# Altium footprint library chipfc_libs.PCBLIB: 283 footprints (part 15 of 18)
Each footprint in its own frame and in the unit in brackets; x right, y up, seen from the top. Pads: shape width x height; smd on the part's side, far side on the other; paste and mask are expansions set on the pad; w line width, h text height; cw(c..) or ccw(c..) is an arc to the next point about the centre after c.
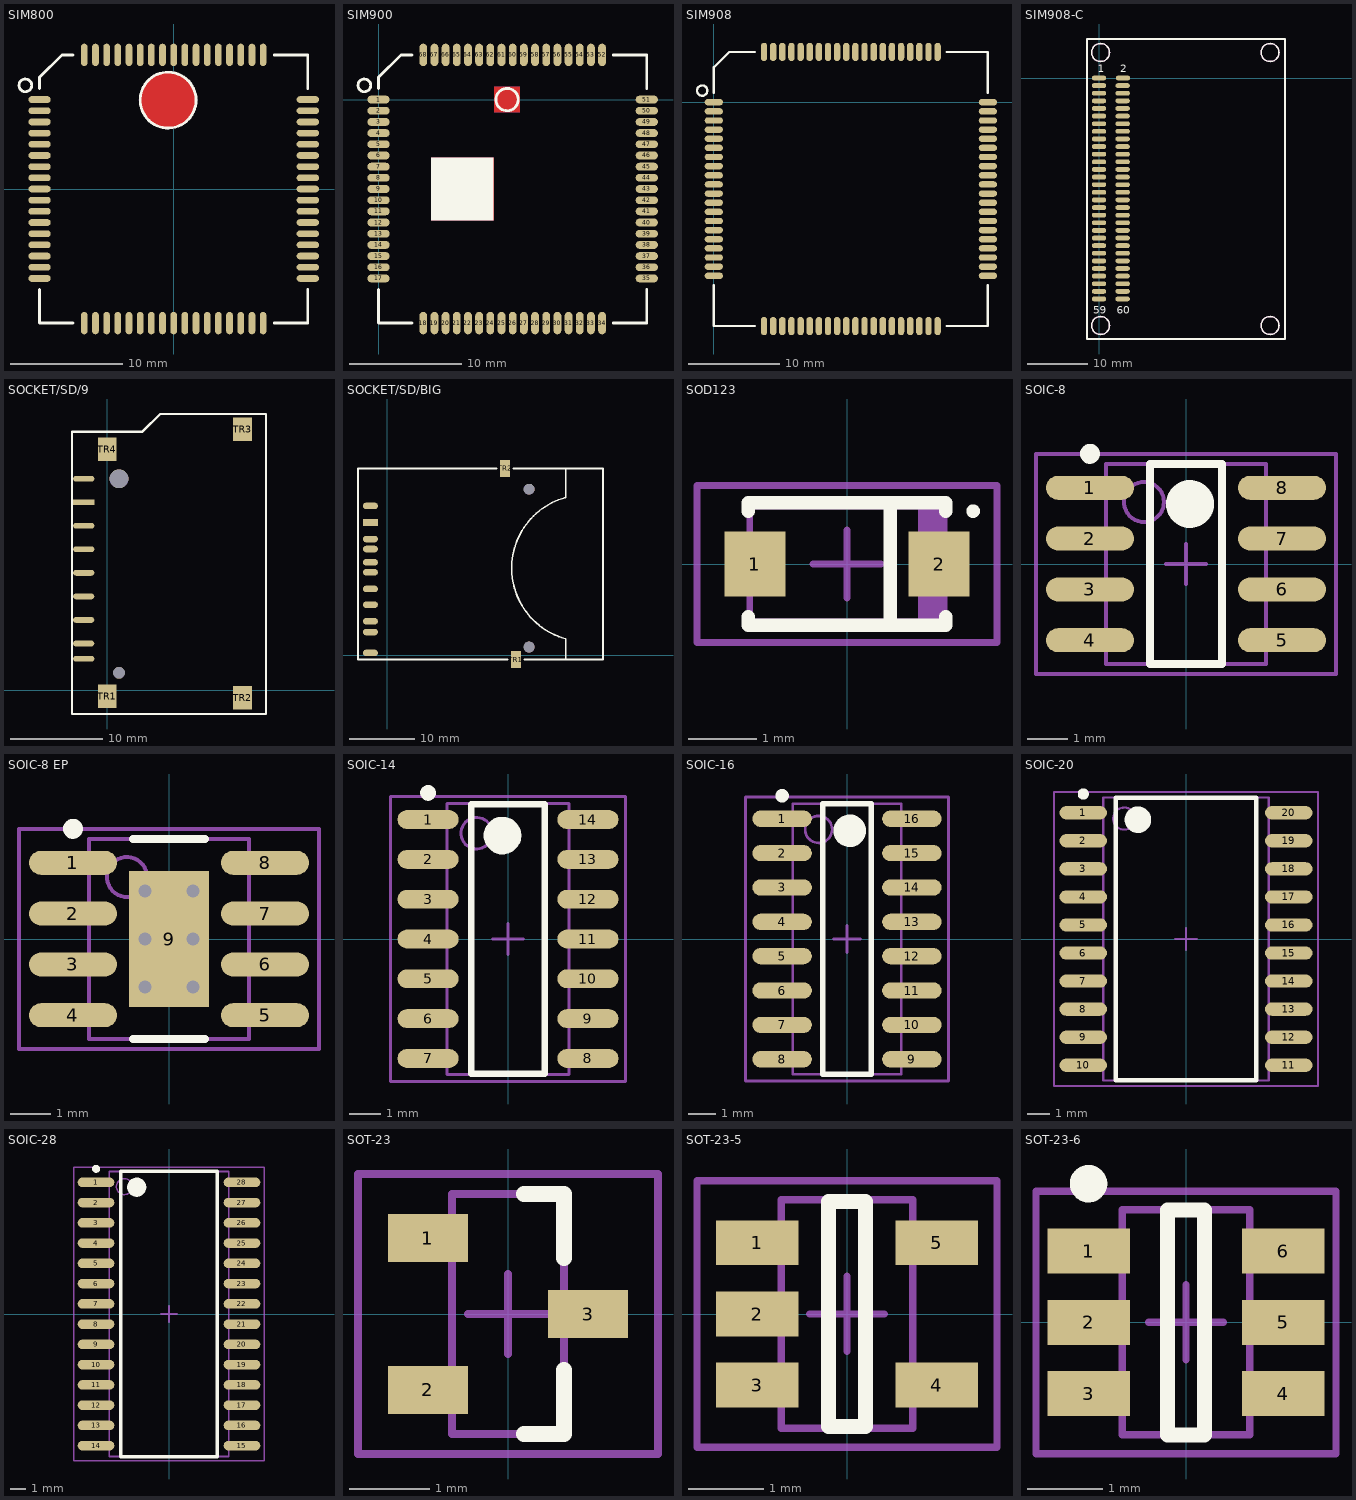
[diagram p14: the footprints below, top view; thin cyan lines are the x and y axes]

## SIM800 [mm]
pads (68):
  oval 2x0.6 smd: 1(-12,8) 2(-12,7) 3(-12,6) 4(-12,5) 5(-12,4) 6(-12,3) 7(-12,2) 8(-12,1) 9(-12,0) 10(-12,-1) 11(-12,-2) 12(-12,-3) 13(-12,-4) 14(-12,-5) 15(-12,-6) 16(-12,-7) 17(-12,-8) 35(12,-8) 36(12,-7) 37(12,-6) 38(12,-5) 39(12,-4) 40(12,-3) 41(12,-2) 42(12,-1) 43(12,0) 44(12,1) 45(12,2) 46(12,3) 47(12,4) 48(12,5) 49(12,6) 50(12,7) 51(12,8)
  oval 0.6x2 smd: 18(-8,-12) 19(-7,-12) 20(-6,-12) 21(-5,-12) 22(-4,-12) 23(-3,-12) 24(-2,-12) 25(-1,-12) 26(0,-12) 27(1,-12) 28(2,-12) 29(3,-12) 30(4,-12) 31(5,-12) 32(6,-12) 33(7,-12) 34(8,-12) 52(8,12) 53(7,12) 54(6,12) 55(5,12) 56(4,12) 57(3,12) 58(2,12) 59(1,12) 60(0,12) 61(-1,12) 62(-2,12) 63(-3,12) 64(-4,12) 65(-5,12) 66(-6,12) 67(-7,12) 68(-8,12)
Top Layer:
  pour cut-out: -3,7.95 -3,8.196 -2.904,8.679 -2.715,9.134 -2.442,9.544 -2.094,9.892 -1.684,10.165 -1.229,10.354 -0.746,10.45 -0.5,10.45 -0.254,10.45 0.229,10.354 0.684,10.165 1.094,9.892 1.442,9.544 1.715,9.134 1.904,8.679 2,8.196 2,7.95 2,7.704 1.904,7.221 1.715,6.766 1.442,6.356 1.094,6.008 0.684,5.735 0.229,5.546 -0.254,5.45 -0.5,5.45 -0.746,5.45 -1.229,5.546 -1.684,5.735 -2.094,6.008 -2.442,6.356 -2.715,6.766 -2.904,7.221 -3,7.704
Bottom Layer:
  pour cut-out: -0.5,10.45 -0.254,10.45 0.229,10.354 0.684,10.165 1.094,9.892 1.442,9.544 1.715,9.134 1.904,8.679 2,8.196 2,7.95 2,7.704 1.904,7.221 1.715,6.766 1.442,6.356 1.094,6.008 0.684,5.735 0.229,5.546 -0.254,5.45 -0.5,5.45 -0.746,5.45 -1.229,5.546 -1.684,5.735 -2.094,6.008 -2.442,6.356 -2.715,6.766 -2.904,7.221 -3,7.704 -3,7.95 -3,8.196 -2.904,8.679 -2.715,9.134 -2.442,9.544 -2.094,9.892 -1.684,10.165 -1.229,10.354 -0.746,10.45
Top Overlay:
  circle w0.254: c-0.5,7.95 r2.5
  circle w0.254: c-13.27,9.27 r0.568
  lines w0.254: -12,-9 -12,-12 -9,-12 ; -12,9 -12,10 -10,12 -9,12 ; 9,-12 12,-12 12,-9 ; 9,12 12,12 12,9
Mechanical 1:
  lines w0.254: -3,7.95 2,7.95 ; -0.5,5.45 -0.5,10.45
3D body "User Library-SIM900.step": height 3.02, standoff 0, extent -12,-12.001 12,11.999

## SIM900 [mm]
pads (68):
  oval 2x0.7 smd: 1(0,0) 2(0,-1) 3(0,-2) 4(0,-3) 5(0,-4) 6(0,-5) 7(0,-6) 8(0,-7) 9(0,-8) 10(0,-9) 11(0,-10) 12(0,-11) 13(0,-12) 14(0,-13) 15(0,-14) 16(0,-15) 17(0,-16) 35(24,-16) 36(24,-15) 37(24,-14) 38(24,-13) 39(24,-12) 40(24,-11) 41(24,-10) 42(24,-9) 43(24,-8) 44(24,-7) 45(24,-6) 46(24,-5) 47(24,-4) 48(24,-3) 49(24,-2) 50(24,-1) 51(24,0)
  oval 0.7x2 smd: 18(4,-20) 19(5,-20) 20(6,-20) 21(7,-20) 22(8,-20) 23(9,-20) 24(10,-20) 25(11,-20) 26(12,-20) 27(13,-20) 28(14,-20) 29(15,-20) 30(16,-20) 31(17,-20) 32(18,-20) 33(19,-20) 34(20,-20) 52(20,4) 53(19,4) 54(18,4) 55(17,4) 56(16,4) 57(15,4) 58(14,4) 59(13,4) 60(12,4) 61(11,4) 62(10,4) 63(9,4) 64(8,4) 65(7,4) 66(6,4) 67(5,4) 68(4,4)
Top Layer:
  pour cut-out: 10.363,1.143 12.649,1.143 12.649,-1.143 10.363,-1.143
  pour cut-out: 4.699,-5.207 10.287,-5.207 10.287,-10.795 4.699,-10.795
Bottom Layer:
  pour cut-out: 4.699,-5.207 10.287,-5.207 10.287,-10.795 4.699,-10.795
  pour cut-out: 10.363,1.143 12.649,1.143 12.649,-1.143 10.363,-1.143
Top Overlay:
  circle w0.254: c11.5,0 r1
  circle w0.254: c-1.27,1.27 r0.568
  rectangle: 4.7,-10.8 10.3,-5.2
  lines w0.254: 0,-17 0,-20 3,-20 ; 0,1 0,2 2,4 3,4 ; 21,-20 24,-20 24,-17 ; 21,4 24,4 24,1
3D body "User Library-SIM900.step": height 3.02, standoff 0, extent 0,-20.001 24,3.999

## SIM908 [mm]
pads (80):
  oval 2x0.7 smd: 1(0,0) 2(0,-1) 3(0,-2) 4(0,-3) 5(0,-4) 6(0,-5) 7(0,-6) 8(0,-7) 9(0,-8) 10(0,-9) 11(0,-10) 12(0,-11) 13(0,-12) 14(0,-13) 15(0,-14) 16(0,-15) 17(0,-16) 18(0,-17) 19(0,-18) 20(0,-19) 41(30,-19) 42(30,-18) 43(30,-17) 44(30,-16) 45(30,-15) 46(30,-14) 47(30,-13) 48(30,-12) 49(30,-11) 50(30,-10) 51(30,-9) 52(30,-8) 53(30,-7) 54(30,-6) 55(30,-5) 56(30,-4) 57(30,-3) 58(30,-2) 59(30,-1) 60(30,0)
  oval 0.7x2 smd: 21(5.5,-24.5) 22(6.5,-24.5) 23(7.5,-24.5) 24(8.5,-24.5) 25(9.5,-24.5) 26(10.5,-24.5) 27(11.5,-24.5) 28(12.5,-24.5) 29(13.5,-24.5) 30(14.5,-24.5) 31(15.5,-24.5) 32(16.5,-24.5) 33(17.5,-24.5) 34(18.5,-24.5) 35(19.5,-24.5) 36(20.5,-24.5) 37(21.5,-24.5) 38(22.5,-24.5) 39(23.5,-24.5) 40(24.5,-24.5) 61(24.5,5.5) 62(23.5,5.5) 63(22.5,5.5) 64(21.5,5.5) 65(20.5,5.5) 66(19.5,5.5) 67(18.5,5.5) 68(17.5,5.5) 69(16.5,5.5) 70(15.5,5.5) 71(14.5,5.5) 72(13.5,5.5) 73(12.5,5.5) 74(11.5,5.5) 75(10.5,5.5) 76(9.5,5.5) 77(8.5,5.5) 78(7.5,5.5) 79(6.5,5.5) 80(5.5,5.5)
Top Overlay:
  circle w0.254: c-1.27,1.27 r0.568
  lines w0.254: 0,-20 0,-24.5 4.5,-24.5 ; 0,1 0,3.81 1.69,5.5 4.5,5.5 ; 25.5,-24.5 30,-24.5 30,-20 ; 25.5,5.5 30,5.5 30,1
3D body "User Library-SIM908.STEP": height 3.19, standoff -0.01, extent -0.016,-24.552 29.984,5.448

## SIM908-C [mm]
pads (60):
  oval 2.4x0.8 smd: 1(0,0) 2(4,0) 3(0,-1.27) 4(3.94,-1.27) 5(0,-2.54) 6(3.94,-2.54) 7(0,-3.81) 8(3.94,-3.81) 9(0,-5.08) 10(3.94,-5.08) 11(0,-6.35) 12(3.94,-6.35) 13(0,-7.62) 14(3.94,-7.62) 15(0,-8.89) 16(3.94,-8.89) 17(0,-10.16) 18(3.94,-10.16) 19(0,-11.43) 20(3.94,-11.43) 21(0,-12.7) 22(3.94,-12.7) 23(0,-13.97) 24(3.94,-13.97) 25(0,-15.24) 26(3.94,-15.24) 27(0,-16.51) 28(3.94,-16.51) 29(0,-17.78) 30(3.94,-17.78) 31(0,-19.05) 32(3.94,-19.05) 33(0,-20.32) 34(3.94,-20.32) 35(0,-21.59) 36(3.94,-21.59) 37(0,-22.86) 38(3.94,-22.86) 39(0,-24.13) 40(3.94,-24.13) 41(0,-25.4) 42(3.94,-25.4) 43(0,-26.67) 44(3.94,-26.67) 45(0,-27.94) 46(3.94,-27.94) 47(0,-29.21) 48(3.94,-29.21) 49(0,-30.48) 50(3.94,-30.48) 51(0,-31.75) 52(3.94,-31.75) 53(0,-33.02) 54(3.94,-33.02) 55(0,-34.29) 56(3.94,-34.29) 57(0,-35.56) 58(3.94,-35.56) 59(0,-36.83) 60(3.94,-36.83)
Top Overlay:
  lines w0.254: -2,-43.5 31,-43.5 31,6.5 -2,6.5 -2,-43.5
  text "1" at -0.25,1 h1.27
  text "2" at 3.5,1 h1.27
  text "59" at -1,-39.25 h1.27
  text "60" at 3,-39.25 h1.27
Top Overlay keep-out:
  circle w0.254: c0.25,4.25 r1.5
  circle w0.254: c0.25,-41.25 r1.5
  circle w0.254: c28.5,4.25 r1.5
  circle w0.254: c28.5,-41.25 r1.5
3D body "User Library-PBD1_27-xx-S (1).step": height 4.5, standoff 0, extent -0.5,-37.465 4.5,0.635

## SOCKET/SD/9 [mil]
pads (15):
  rect 90x25 smd: 1(-100,800)
  oval 90x25 smd: 2(-100,700) 3(-100,600) 4(-100,500) 5(-100,400) 6(-100,300) 7(-100,200) 8(-100,135) 9(-100,900)
  round 80 / inner round 60 / far side round 80 hole 80: HOLD1(50,900)
  round 50 / inner round 60 / far side round 50 hole 50: HOLD2(50,75)
  rect 80x100 smd: TR1(0,-25) TR2(575,-30) TR3(575,1110) TR4(0,1025)
Top Overlay:
  lines w10: -150,-100 -150,1100 150,1100 225,1175 675,1175 675,-100 -150,-100
  text ".Designator" at 75,662.5 h56.25
Mechanical 1:
  text ".Comment" at 0,225 h56.25
  text ".Designator" at 0,337.5 h56.25
  text ".Pattern" at 0,0 h56.25

## SOCKET/SD/BIG [mil]
pads (15):
  rect 90x40 smd: 1(-100,800)
  oval 90x40 smd: 2(-100,700) 3(-100,560) 4(-100,500) 5(-100,400) 6(-100,305) 7(-100,205) 8(-100,140) 9(-100,900) 10(-100,15) 11(-100,640)
  round 65 / inner round 60 / far side round 65 hole 65: HOLD1(855,50) HOLD2(855,1000)
  rect 60x100 smd: TR1(775,-25) TR2(710,1125)
Top Overlay:
  lines w10: 660,1125 -175,1125 ; 725,-25 -175,-25 ; 760,1125 1300,1125 1300,-25 825,-25 ; 1075,-25 1075,100 cw(c1190.38,525) 1075,950 1075,1125 ; -175,-25 -175,1125 ; -175,-25 700,-25 -175,-25 ; -175,-25 -175,1125 ; -175,-25 -175,1125 ; -175,1125 650,1125 -175,1125
  text ".Designator" at 195,467.5 h56.25

## SOD123 [mm] "Molded Diode, 2-Leads, Body 2.7x1.6mm, IPC Medium Density"
height 1.35
pads (2):
  rect 0.9x0.95 smd: 1(-1.35,0) 2(1.35,0)
Top Overlay:
  circle w0.1: c1.85,0.775 r0.05
  lines w0.2: -1.45,-0.775 -1.45,-0.9 1.45,-0.9 1.45,-0.775 ; -1.45,0.775 -1.45,0.9 1.45,0.9 1.45,0.775 ; 0.635,-0.889 0.635,0.889
Mechanical 13:
  rectangle: 1.042,-0.85 1.425,0.85
  lines w0.1: -1.425,-0.85 -1.425,0.85 1.425,0.85 1.425,-0.85 -1.425,-0.85
Mechanical 15:
  lines w0.1: -0.5,0 0.5,0 ; 0,-0.5 0,0.5 ; -2.2,-1.15 -2.2,1.15 2.2,1.15 2.2,-1.15 -2.2,-1.15
3D body "User Library-SOD3716X14.step": height 1.35, standoff 0, extent -1.85,-0.775 1.85,0.775

## SOIC-8 [mm] "SOIC, 8-Leads, Body 5.0x4.0mm (max), Pitch 1.27mm, IPC Medium Density"
height 1.75
pads (8):
  oval 2.2x0.6 smd: 1(-2.4,1.905) 2(-2.4,0.635) 3(-2.4,-0.635) 4(-2.4,-1.905) 5(2.4,-1.905) 6(2.4,-0.635) 7(2.4,0.635) 8(2.4,1.905)
Top Overlay:
  circle w0.25: c-2.4,2.755 r0.125
  circle w0.6: c0.1,1.5 r0.3
  lines w0.2: -0.9,-2.5 -0.9,2.5 0.9,2.5 0.9,-2.5 -0.9,-2.5
Mechanical 13:
  circle w0.1: c-1.05,1.55 r0.5
  lines w0.1: -2,-2.5 -2,2.5 2,2.5 2,-2.5 -2,-2.5
Mechanical 15:
  lines w0.1: -0.5,0 0.5,0 ; 0,-0.5 0,0.5 ; -3.75,-2.75 -3.75,2.75 3.75,2.75 3.75,-2.75 -3.75,-2.75
3D body "User Library-SOIC-8-1.step": height 1.75, standoff 0, extent -3,-2.487 3,2.413

## SOIC-8 EP [mm] "SOIC, 8-Leads, Body 5.0x4.0mm (max), Pitch 1.27mm, IPC Medium Density"
height 1.75
pads (9):
  oval 2.2x0.6 smd: 1(-2.4,1.905) 2(-2.4,0.635) 3(-2.4,-0.635) 4(-2.4,-1.905) 5(2.4,-1.905) 6(2.4,-0.635) 7(2.4,0.635) 8(2.4,1.905)
  rect 2x3.4 smd: 9(0,0)
via -0.6,1.2 diameter 0.66 hole 0.33
via 0.6,1.2 diameter 0.66 hole 0.33
via -0.6,0 diameter 0.66 hole 0.33
via 0.6,0 diameter 0.66 hole 0.33
via -0.6,-1.2 diameter 0.66 hole 0.33
via 0.6,-1.2 diameter 0.66 hole 0.33
Top Overlay:
  circle w0.25: c-2.4,2.755 r0.125
  lines w0.2: -0.9,-2.5 0.9,-2.5 ; -0.9,2.5 0.9,2.5
Mechanical 13:
  circle w0.1: c-1.05,1.55 r0.5
  lines w0.1: -2,-2.5 -2,2.5 2,2.5 2,-2.5 -2,-2.5
Mechanical 15:
  lines w0.1: -0.5,0 0.5,0 ; 0,-0.5 0,0.5 ; -3.75,-2.75 -3.75,2.75 3.75,2.75 3.75,-2.75 -3.75,-2.75
3D body "User Library-SOIC-8-1.step": height 1.75, standoff 0, extent -3,-2.487 3,2.413

## SOIC-14 [mm] "SOIC, 14-Leads, Body 8.6x3.9mm (max), Pitch 1.27mm, IPC Medium Density"
height 1.75
pads (14):
  oval 1.95x0.6 smd: 1(-2.55,3.81) 2(-2.55,2.54) 3(-2.55,1.27) 4(-2.55,0) 5(-2.55,-1.27) 6(-2.55,-2.54) 7(-2.55,-3.81) 8(2.55,-3.81) 9(2.55,-2.54) 10(2.55,-1.27) 11(2.55,0) 12(2.55,1.27) 13(2.55,2.54) 14(2.55,3.81)
Top Overlay:
  circle w0.6: c-0.175,3.3 r0.3
  circle w0.25: c-2.55,4.66 r0.125
  lines w0.2: -1.175,-4.3 1.175,-4.3 1.175,4.3 -1.175,4.3 -1.175,-4.3
Mechanical 13:
  circle w0.1: c-1,3.375 r0.5
  lines w0.1: -1.95,-4.325 1.95,-4.325 1.95,4.325 -1.95,4.325 -1.95,-4.325
Mechanical 15:
  lines w0.1: -0.5,0 0.5,0 ; 0,-0.5 0,0.5 ; -3.75,-4.55 3.75,-4.55 3.75,4.55 -3.75,4.55 -3.75,-4.55
3D body "SOIC-14.step": height 1.95, standoff 0, extent -3.028,-4.343 3.028,4.357

## SOIC-16 [mm] "SOIC, 16-Leads, Body 10.0x4.0mm (max), Pitch 1.27mm, IPC Medium Density"
height 1.75
pads (16):
  oval 2.2x0.6 smd: 1(-2.4,4.445) 2(-2.4,3.175) 3(-2.4,1.905) 4(-2.4,0.635) 5(-2.4,-0.635) 6(-2.4,-1.905) 7(-2.4,-3.175) 8(-2.4,-4.445) 9(2.4,-4.445) 10(2.4,-3.175) 11(2.4,-1.905) 12(2.4,-0.635) 13(2.4,0.635) 14(2.4,1.905) 15(2.4,3.175) 16(2.4,4.445)
Top Overlay:
  circle w0.25: c-2.4,5.295 r0.125
  circle w0.6: c0.1,4 r0.3
  lines w0.2: -0.9,-5 -0.9,5 0.9,5 0.9,-5 -0.9,-5
Mechanical 13:
  circle w0.1: c-1.05,4.05 r0.5
  lines w0.1: -2,-5 -2,5 2,5 2,-5 -2,-5
Mechanical 15:
  lines w0.1: -0.5,0 0.5,0 ; 0,-0.5 0,0.5 ; -3.75,-5.25 -3.75,5.25 3.75,5.25 3.75,-5.25 -3.75,-5.25
3D body "User Library-SOIC-16-1.step": height 1.4, standoff 0, extent -3,-4.95 3,4.95

## SOIC-20 [mm] "SOIC, 20-Leads, Body 12.8x7.5mm (max), Pitch 1.27mm, IPC Medium Density"
height 2.65
pads (20):
  oval 2.15x0.6 smd: 1(-4.65,5.715) 2(-4.65,4.445) 3(-4.65,3.175) 4(-4.65,1.905) 5(-4.65,0.635) 6(-4.65,-0.635) 7(-4.65,-1.905) 8(-4.65,-3.175) 9(-4.65,-4.445) 10(-4.65,-5.715) 11(4.65,-5.715) 12(4.65,-4.445) 13(4.65,-3.175) 14(4.65,-1.905) 15(4.65,-0.635) 16(4.65,0.635) 17(4.65,1.905) 18(4.65,3.175) 19(4.65,4.445) 20(4.65,5.715)
Top Overlay:
  circle w0.25: c-4.65,6.565 r0.125
  circle w0.6: c-2.175,5.4 r0.3
  lines w0.2: -3.175,-6.4 -3.175,6.4 3.175,6.4 3.175,-6.4 -3.175,-6.4
Mechanical 13:
  circle w0.1: c-2.8,5.45 r0.5
  lines w0.1: -3.75,-6.4 -3.75,6.4 3.75,6.4 3.75,-6.4 -3.75,-6.4
Mechanical 15:
  lines w0.1: -0.5,0 0.5,0 ; 0,-0.5 0,0.5 ; -5.975,-6.65 -5.975,6.65 5.975,6.65 5.975,-6.65 -5.975,-6.65
3D body "SO20.step": height 2.8, standoff 0, extent -5.08,-6.5 5.256,6.5

## SOIC-28 [mm] "SOIC, 28-Leads, Body 17.9x7.5mm (max), Pitch 1.27mm, IPC Medium Density"
height 2.5
pads (28):
  oval 2.3x0.6 smd: 1(-4.575,8.255) 2(-4.575,6.985) 3(-4.575,5.715) 4(-4.575,4.445) 5(-4.575,3.175) 6(-4.575,1.905) 7(-4.575,0.635) 8(-4.575,-0.635) 9(-4.575,-1.905) 10(-4.575,-3.175) 11(-4.575,-4.445) 12(-4.575,-5.715) 13(-4.575,-6.985) 14(-4.575,-8.255) 15(4.575,-8.255) 16(4.575,-6.985) 17(4.575,-5.715) 18(4.575,-4.445) 19(4.575,-3.175) 20(4.575,-1.905) 21(4.575,-0.635) 22(4.575,0.635) 23(4.575,1.905) 24(4.575,3.175) 25(4.575,4.445) 26(4.575,5.715) 27(4.575,6.985) 28(4.575,8.255)
Top Overlay:
  circle w0.6: c-2.025,7.95 r0.3
  circle w0.25: c-4.575,9.105 r0.125
  lines w0.2: -3.025,-8.95 3.025,-8.95 3.025,8.95 -3.025,8.95 -3.025,-8.95
Mechanical 13:
  circle w0.1: c-2.8,7.985 r0.5
  lines w0.1: -3.75,-8.935 3.75,-8.935 3.75,8.935 -3.75,8.935 -3.75,-8.935
Mechanical 15:
  lines w0.1: -0.5,0 0.5,0 ; 0,-0.5 0,0.5 ; -5.975,-9.2 5.975,-9.2 5.975,9.2 -5.975,9.2 -5.975,-9.2
3D body "User Library-SOIC.step": height 1.7, standoff 0, extent -5.321,-8.763 5.321,8.763

## SOT-23 [mm] "SOT23, 3-Leads, Body 3.0x2.5mm (max), Pitch 0.95mm, IPC Medium Density"
height 1
pads (3):
  rect 1x0.6 smd: 1(-1,0.95) 2(-1,-0.95) 3(1,0)
Top Overlay:
  lines w0.2: 0.2,-1.5 0.7,-1.5 0.7,-0.7 ; 0.2,1.5 0.7,1.5 0.7,0.7
Mechanical 13:
  lines w0.1: -0.7,-1.5 0.7,-1.5 0.7,1.5 -0.7,1.5 -0.7,-1.5
Mechanical 15:
  lines w0.1: -0.5,0 0.5,0 ; 0,-0.5 0,0.5 ; -1.875,-1.75 1.875,-1.75 1.875,1.75 -1.875,1.75 -1.875,-1.75
3D body "User Library-SOT-23-1.STEP": height 0.95, standoff -0.04, extent -1.278,-1.46 1.27,1.46

## SOT-23-5 [mm] "SOT23, 5-Leads, Body 3.0x3.0mm (max), Pitch 0.95mm, IPC Medium Density"
height 1.45
pads (5):
  rect 1.1x0.6 smd: 1(-1.2,0.95) 2(-1.2,0) 3(-1.2,-0.95) 4(1.2,-0.95) 5(1.2,0.95)
Top Overlay:
  lines w0.2: -0.25,-1.5 0.25,-1.5 0.25,1.5 -0.25,1.5 -0.25,-1.5
Mechanical 13:
  lines w0.1: -0.875,-1.525 -0.875,1.525 0.875,1.525 0.875,-1.525 -0.875,-1.525
Mechanical 15:
  lines w0.1: -0.5,0 0.5,0 ; 0,-0.5 0,0.5 ; -2,-1.775 -2,1.775 2,1.775 2,-1.775 -2,-1.775
3D body "User Library-sot235.step": height 1, standoff 0, extent -1.17,-1.46 1.17,1.46

## SOT-23-6 [mm] "SOT23, 6-Leads, Body 3.0x3.0mm (max), Pitch 0.95mm, IPC Medium Density"
height 1.1
pads (6):
  rect 1.1x0.6 smd: 1(-1.3,0.95) 2(-1.3,0) 3(-1.3,-0.95) 4(1.3,-0.95) 5(1.3,0) 6(1.3,0.95)
Top Overlay:
  circle w0.25: c-1.3,1.85 r0.125
  lines w0.2: -0.25,-1.5 -0.25,1.5 0.25,1.5 0.25,-1.5 -0.25,-1.5
Mechanical 13:
  lines w0.1: -0.85,-1.5 0.85,-1.5 0.85,1.5 -0.85,1.5 -0.85,-1.5
Mechanical 15:
  lines w0.1: -0.5,0 0.5,0 ; 0,-0.5 0,0.5 ; -2,-1.75 2,-1.75 2,1.75 -2,1.75 -2,-1.75
3D body "User Library-SOT-23-6.step": height 1.09, standoff 0, extent -1.27,-1.397 1.156,1.397